# Altium footprint library Supernova Connectors.PcbLib: 303 footprints (part 15 of 19)
Each footprint in its own frame and in the unit in brackets; x right, y up, seen from the top. Pads: shape width x height; smd on the part's side, far side on the other; paste and mask are expansions set on the pad; w line width, h text height; cw(c..) or ccw(c..) is an arc to the next point about the centre after c.
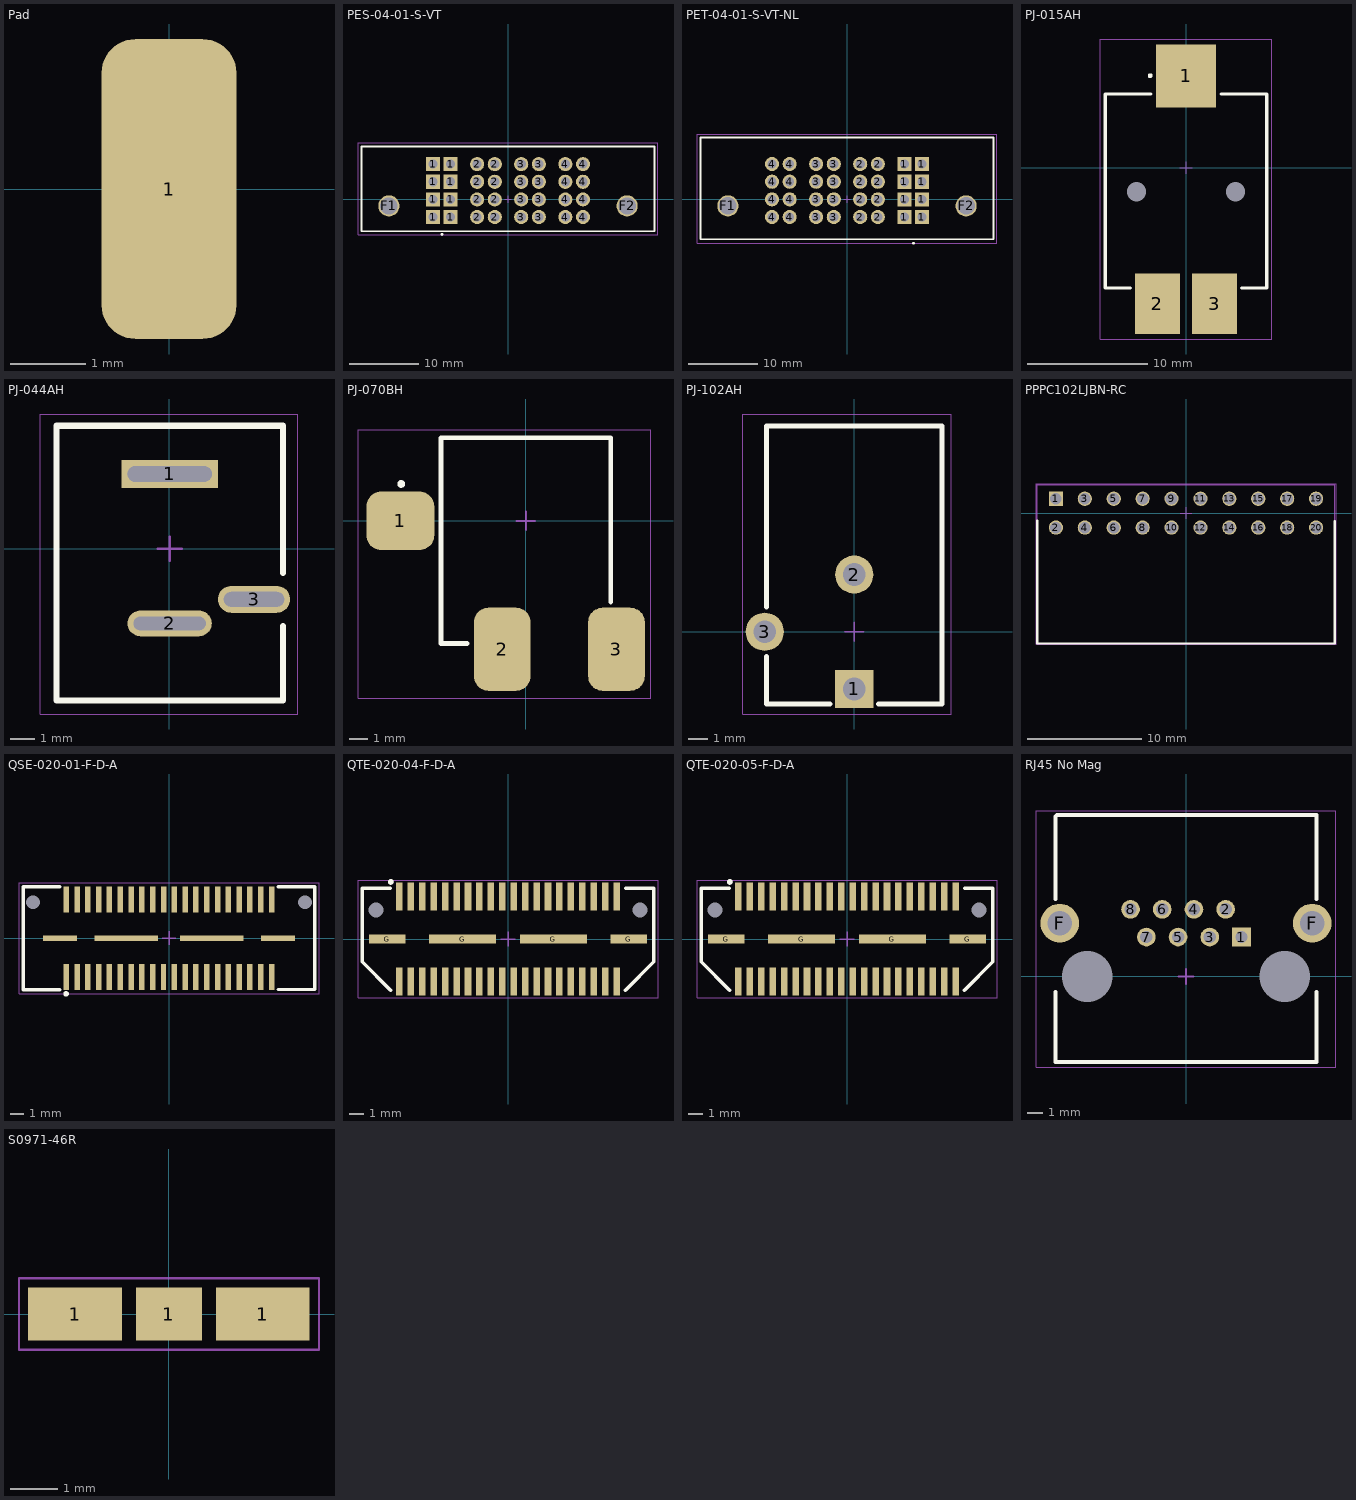
[diagram p14: the footprints below, top view; thin cyan lines are the x and y axes]

## Pad [mm]
pads (1):
  rrect50% 1.8x4 smd paste-2: 1(0,0)

## PES-04-01-S-VT [mil]
pads (34):
  rect 80x80 hole 52: 1(-425,-100) 1(-425,0) 1(-425,100) 1(-425,200) 1(-325,-100) 1(-325,0) 1(-325,100) 1(-325,200)
  round 80 hole 52: 2(-175,-100) 2(-175,0) 2(-175,100) 2(-175,200) 2(-75,-100) 2(-75,0) 2(-75,100) 2(-75,200) 3(75,-100) 3(75,0) 3(75,100) 3(75,200) 3(175,-100) 3(175,0) 3(175,100) 3(175,200) 4(325,-100) 4(325,0) 4(325,100) 4(325,200) 4(425,-100) 4(425,0) 4(425,100) 4(425,200)
  round 120 hole 98: F1(-675,-37) F2(675,-37)
Top Overlay:
  circle w8: c-374.53,-198.05 r4
  lines w10: -830,-180 -830,300 830,300 830,-180 -830,-180
Top Courtyard:
  lines w1.97: -850,-200 850,-200 850,320 -850,320 -850,-200
  lines w3.94: -19.68,0 19.68,0 ; 0,-19.68 0,19.69
3D body "PES-04-01-S-VT.stp": height 670.23, standoff -93.16, extent -825,-175.22 825,297.22

## PET-04-01-S-VT-NL [mil]
pads (34):
  rect 80x80 hole 52: 1(325,-100) 1(325,0) 1(325,100) 1(325,200) 1(425,-100) 1(425,0) 1(425,100) 1(425,200)
  round 80 hole 52: 2(75,-100) 2(75,0) 2(75,100) 2(75,200) 2(175,-100) 2(175,0) 2(175,100) 2(175,200) 3(-175,-100) 3(-175,0) 3(-175,100) 3(-175,200) 3(-75,-100) 3(-75,0) 3(-75,100) 3(-75,200) 4(-425,-100) 4(-425,0) 4(-425,100) 4(-425,200) 4(-325,-100) 4(-325,0) 4(-325,100) 4(-325,200)
  round 120 hole 98: F1(-675,-37) F2(675,-37)
Top Overlay:
  circle w8: c376.67,-248.56 r4
  lines w10: -830,-225.43 -830,350 830,350 830,-225.43 -830,-225.43
Top Courtyard:
  lines w1.97: -850,-250 850,-250 850,370 -850,370 -850,-250
  lines w3.94: -19.68,0 19.68,0 ; 0,-19.68 0,19.69
3D body "PET-04-01-S-VT-NL.stp": height 577.59, standoff -90.52, extent -825.31,-225.43 824.69,345.44

## PJ-015AH [mm]
pads (5):
  rect 5x5.2 smd paste-0.4: 1(0,7.6)
  rect 3.75x5 smd paste-0.4: 2(-2.375,-11.3) 3(2.375,-11.3)
  round 1.524 hole 1.6: ""(-4.1,-2) ""(4.1,-2)
Top Overlay:
  circle w0.203: c-2.97,7.62 r0.102
  lines w0.254: -4.6,-10 -6.7,-10 -6.7,6.1 -2.9,6.1 ; 2.9,6.1 6.7,6.1 6.7,-10 4.6,-10
Top Courtyard:
  lines w0.05: -7.112,-14.224 7.112,-14.224 7.112,10.668 -7.112,10.668 -7.112,-14.224
  lines w0.1: -0.5,0 0.5,0 ; 0,-0.5 0,0.5
3D body "PJ-015AH-SMT.stp": height 14.51, standoff -1.39, extent -6.5,-12.915 6.5,9.215

## PJ-044AH [mm]
pads (3):
  rect 4x1.168 hole 0.66 slot 3.5 at 0 deg: 1(0.028,3.1)
  oval 3.5x1.067 hole 0.559 slot 3 at 0 deg: 2(0.028,-3.1)
  oval 3x1.118 hole 0.61 slot 2.5 at 0 deg: 3(3.528,-2.1)
Top Overlay:
  lines w0.254: 4.728,-3.2 4.728,-6.3 -4.672,-6.3 -4.672,5.1 4.728,5.1 4.728,-1
Top Courtyard:
  lines w0.05: -5.334,-6.858 5.334,-6.858 5.334,5.588 -5.334,5.588 -5.334,-6.858
  lines w0.1: -0.472,0 0.528,0 ; 0.028,-0.5 0.028,0.5
3D body "PJ-044AH.stp": height 14.2, standoff -3, extent -4.472,-6.1 4.528,4.9

## PJ-070BH [mm]
pads (3):
  rrect50% 3.6x3.1 smd paste-0.3: 1(-6.65,0)
  rrect50% 3x4.4 smd paste-0.3: 2(-1.25,-6.8) 3(4.8,-6.8)
Top Overlay:
  circle w0.203: c-6.604,1.954 r0.102
  lines w0.254: -3.1,-6.5 -4.5,-6.5 -4.5,4.4 4.5,4.4 4.5,-4.3
Top Courtyard:
  lines w0.05: -8.89,-9.398 -8.89,4.826 6.604,4.826 6.604,-9.398 -8.89,-9.398
  lines w0.1: -0.5,0 0.5,0 ; 0,-0.5 0,0.5
3D body "pj-070bh-smt.stp": height 14.1, standoff 0, extent -8.35,-8.9 7.135,4.4

## PJ-102AH [mm]
pads (3):
  rect 2x2 hole 1.2: 1(0,-3)
  round 2 hole 1.2: 2(0,3) 3(-4.7,0)
Top Overlay:
  lines w0.254: -4.6,-1.3 -4.6,-3.8 -1.27,-3.8 ; -4.6,1.3 -4.6,10.8 4.6,10.8 4.6,-3.8 1.27,-3.8
Top Courtyard:
  lines w0.05: -5.842,-4.318 -5.842,11.43 5.08,11.43 5.08,-4.318 -5.842,-4.318
  lines w0.1: -0.5,0 0.5,0 ; 0,-0.5 0,0.5
3D body "PJ-102AH.STEP": height 11, standoff -3.5, extent -4.892,-3.7 4.5,10.7

## PPPC102LJBN-RC [mm] "PPPC102LJBN-RC"
height 11.05
pads (20):
  rect 1.25x1.25 hole 1.02: 1(-11.43,1.27)
  round 1.25 hole 1.02: 2(-11.43,-1.27) 3(-8.89,1.27) 4(-8.89,-1.27) 5(-6.35,1.27) 6(-6.35,-1.27) 7(-3.81,1.27) 8(-3.81,-1.27) 9(-1.27,1.27) 10(-1.27,-1.27) 11(1.27,1.27) 12(1.27,-1.27) 13(3.81,1.27) 14(3.81,-1.27) 15(6.35,1.27) 16(6.35,-1.27) 17(8.89,1.27) 18(8.89,-1.27) 19(11.43,1.27) 20(11.43,-1.27)
Top Overlay:
  lines w0.2: -13.08,-0.635 -13.08,-11.455 13.08,-11.455 13.08,-0.7
Top 3D Body:
  lines w0.1: -13.081,2.5 13.08,2.5 13.08,-11.455 -13.08,-11.455 -13.08,2.5
Top Courtyard:
  lines w0.05: -13.18,-11.532 -13.18,2.6 13.18,2.6 13.18,-11.532 -13.18,-11.532
  lines w0.1: -0.5,0 0.5,0 ; 0,-0.5 0,0.5
3D body "SSW-110-02-G-D-RA.stp": height 5.02, standoff -2.46, extent -12.954,-11.29 12.954,1.486

## QSE-020-01-F-D-A [mil]
pads (46):
  rect 16x76.5 smd mask+2: 1(-299.49,-112.8) 2(-299.46,112.8) 3(-268,-112.8) 4(-267.97,112.8) 5(-236.5,-112.8) 6(-236.47,112.8) 7(-205.01,-112.8) 8(-204.98,112.8) 9(-173.51,-112.8) 10(-173.48,112.8) 11(-142.01,-112.8) 12(-141.98,112.8) 13(-110.52,-112.8) 14(-110.49,112.8) 15(-79.02,-112.8) 16(-78.99,112.8) 17(-47.52,-112.8) 18(-47.49,112.8) 19(-16.03,-112.8) 20(-16,112.8) 21(15.47,-112.8) 22(15.5,112.8) 23(46.96,-112.8) 24(46.99,112.8) 25(78.46,-112.8) 26(78.49,112.8) 27(109.96,-112.8) 28(109.99,112.8) 29(141.45,-112.8) 30(141.48,112.8) 31(172.95,-112.8) 32(172.98,112.8) 33(204.44,-112.8) 34(204.47,112.8) 35(235.94,-112.8) 36(235.97,112.8) 37(267.44,-112.8) 38(267.47,112.8) 39(298.93,-112.8) 40(298.96,112.8)
  rect 100x16.93 smd mask+2: G(-317.52,0) G(317.52,0)
  rect 185.04x16.93 smd mask+2: G(-125,0) G(125,0)
  round 23.62 hole 40.16 unplated: ""(-396.26,104.92) ""(396.26,104.92)
Top Overlay:
  circle w8: c-299.81,-162.03 r4
  lines w10: -318.83,-149.65 -425.2,-149.65 -425.2,149.61 -318.83,149.61 ; 317.52,149.61 424.64,149.61 424.64,-149.4 318.27,-149.4
Top Courtyard:
  lines w1.97: -437.01,-161.42 -437.01,161.42 437.01,161.42 437.01,-161.42 -437.01,-161.42
  lines w3.94: -19.68,0 19.68,0 ; 0,-19.68 0,19.69
3D body "QSE-020-01-F-D-A.stp": height 128, standoff -30, extent -418.99,-147.49 419,147.51

## QTE-020-04-F-D-A [mil]
pads (46):
  rect 18x76.5 smd mask+2: 1(-299.23,117.32) 2(-299.2,-117.32) 3(-267.73,117.32) 4(-267.7,-117.32) 5(-236.24,117.32) 6(-236.21,-117.32) 7(-204.74,117.32) 8(-204.71,-117.32) 9(-173.24,117.32) 10(-173.21,-117.32) 11(-141.75,117.32) 12(-141.72,-117.32) 13(-110.25,117.32) 14(-110.22,-117.32) 15(-78.76,117.32) 16(-78.73,-117.32) 17(-47.26,117.32) 18(-47.23,-117.32) 19(-15.76,117.32) 20(-15.73,-117.32) 21(15.73,117.32) 22(15.76,-117.32) 23(47.23,117.32) 24(47.26,-117.32) 25(78.73,117.32) 26(78.76,-117.32) 27(110.22,117.32) 28(110.25,-117.32) 29(141.72,117.32) 30(141.75,-117.32) 31(173.21,117.32) 32(173.24,-117.32) 33(204.71,117.32) 34(204.74,-117.32) 35(236.21,117.32) 36(236.24,-117.32) 37(267.7,117.32) 38(267.73,-117.32) 39(299.2,117.32) 40(299.23,-117.32)
  rect 100x25.2 smd mask+2: G(-332.48,0) G(332.48,0)
  rect 185.04x25.2 smd mask+2: G(-125,0) G(125,0)
  round 23.62 hole 40.16 unplated: ""(-363.78,79.92) ""(363.78,79.92)
Top Overlay:
  circle w8: c-322.83,157.48 r4
  lines w10: -401.54,-62.99 -323.54,-141 ; -401.57,-62.96 -401.57,140 -324.57,140 ; 323.57,-141 401.57,-62.99 401.57,140 324.54,140
Top Courtyard:
  lines w1.97: -413.39,-161.42 -413.39,161.42 413.39,161.42 413.39,-161.42 -413.39,-161.42
  lines w3.94: -19.68,0 19.68,0 ; 0,-19.68 0,19.69
3D body "QTE-020-04-F-D-A.stp": height 601, standoff -30, extent -394,-141 394,140

## QTE-020-05-F-D-A [mil]
pads (46):
  rect 18x76.5 smd mask+2: 1(-299.23,117.32) 2(-299.2,-117.32) 3(-267.73,117.32) 4(-267.7,-117.32) 5(-236.24,117.32) 6(-236.21,-117.32) 7(-204.74,117.32) 8(-204.71,-117.32) 9(-173.24,117.32) 10(-173.21,-117.32) 11(-141.75,117.32) 12(-141.72,-117.32) 13(-110.25,117.32) 14(-110.22,-117.32) 15(-78.76,117.32) 16(-78.73,-117.32) 17(-47.26,117.32) 18(-47.23,-117.32) 19(-15.76,117.32) 20(-15.73,-117.32) 21(15.73,117.32) 22(15.76,-117.32) 23(47.23,117.32) 24(47.26,-117.32) 25(78.73,117.32) 26(78.76,-117.32) 27(110.22,117.32) 28(110.25,-117.32) 29(141.72,117.32) 30(141.75,-117.32) 31(173.21,117.32) 32(173.24,-117.32) 33(204.71,117.32) 34(204.74,-117.32) 35(236.21,117.32) 36(236.24,-117.32) 37(267.7,117.32) 38(267.73,-117.32) 39(299.2,117.32) 40(299.23,-117.32)
  rect 100x25.2 smd mask+2: G(-332.48,0) G(332.48,0)
  rect 185.04x25.2 smd mask+2: G(-125,0) G(125,0)
  round 23.62 hole 40.16 unplated: ""(-363.78,79.92) ""(363.78,79.92)
Top Overlay:
  circle w8: c-322.83,157.48 r4
  lines w10: -401.54,-62.99 -323.54,-141 ; -401.57,-62.96 -401.57,140 -324.57,140 ; 323.57,-141 401.57,-62.99 401.57,140 324.54,140
Top Courtyard:
  lines w1.97: -413.39,-161.42 413.39,-161.42 413.39,161.42 -413.39,161.42 -413.39,-161.42
  lines w3.94: -19.68,0 19.68,0 ; 0,-19.68 0,19.69
3D body "QTE-020-05-F-D-A.stp": height 719, standoff -30, extent -394,-141 394,140

## RJ45 No Mag [mm]
pads (12):
  rect 1.2x1.2 hole 0.8: 1(3.57,2.54)
  round 1.2 hole 0.8: 2(2.55,4.32) 3(1.53,2.54) 4(0.51,4.32) 5(-0.51,2.54) 6(-1.53,4.32) 7(-2.55,2.54) 8(-3.57,4.32)
  round 2.5 hole 1.6: F(-8.125,3.43) F(8.125,3.43)
  round 3 hole 3.25 unplated: ""(-6.35,0) ""(6.35,0)
Top Overlay:
  lines w0.254: -8.4,-1 -8.4,-5.5 8.4,-5.5 8.4,-1 ; -8.4,5 -8.4,10.3 -8.3,10.4 8.4,10.4 8.4,5
Top Courtyard:
  lines w0.05: -9.652,-5.842 -9.652,10.668 9.652,10.668 9.652,-5.842 -9.652,-5.842
  lines w0.1: -0.5,0 0.5,0 ; 0,-0.5 0,0.5
3D body "615008140621.stp": height 14.72, standoff -3.52, extent -9.75,-5.475 9.75,10.375

## S01-50250500 [mm] "RF Shield"
3D body "s01-50250500.stp": height 5.5, standoff 0.2, extent -12.65,-25.15 12.65,25.15

## S02-30200250 [mm] "RF Shield"
3D body "s02-30200250.stp": height 2.95, standoff 0.25, extent -10.1,-15.1 10.1,15.1

## S02-30200500 [mm] "RF Shield"
3D body "s01-30200500.stp": height 5.45, standoff 0.15, extent -10.15,-15.15 10.15,15.15

## S0971-46R [mm] "EMI Shield Clip"
pads (3):
  rect 2x1.125 smd: 1(-2,0) 1(2,0)
  rect 1.4x1.125 smd: 1(0,0)
Top Courtyard:
  lines w0.05: -3.197,-0.762 -3.197,0.762 3.2,0.762 3.2,-0.762 -3.197,-0.762
  lines w0.1: -0.5,0 0.5,0 ; 0,-0.5 0,0.5
3D body "s0971-46.stp": height 2, standoff 0, extent -2.9,-0.5 2.9,0.5